# Altium footprint library Library.PcbLib: 292 footprints (part 3 of 20)
Each footprint in its own frame and in the unit in brackets; x right, y up, seen from the top. Pads: shape width x height; smd on the part's side, far side on the other; paste and mask are expansions set on the pad; w line width, h text height; cw(c..) or ccw(c..) is an arc to the next point about the centre after c.
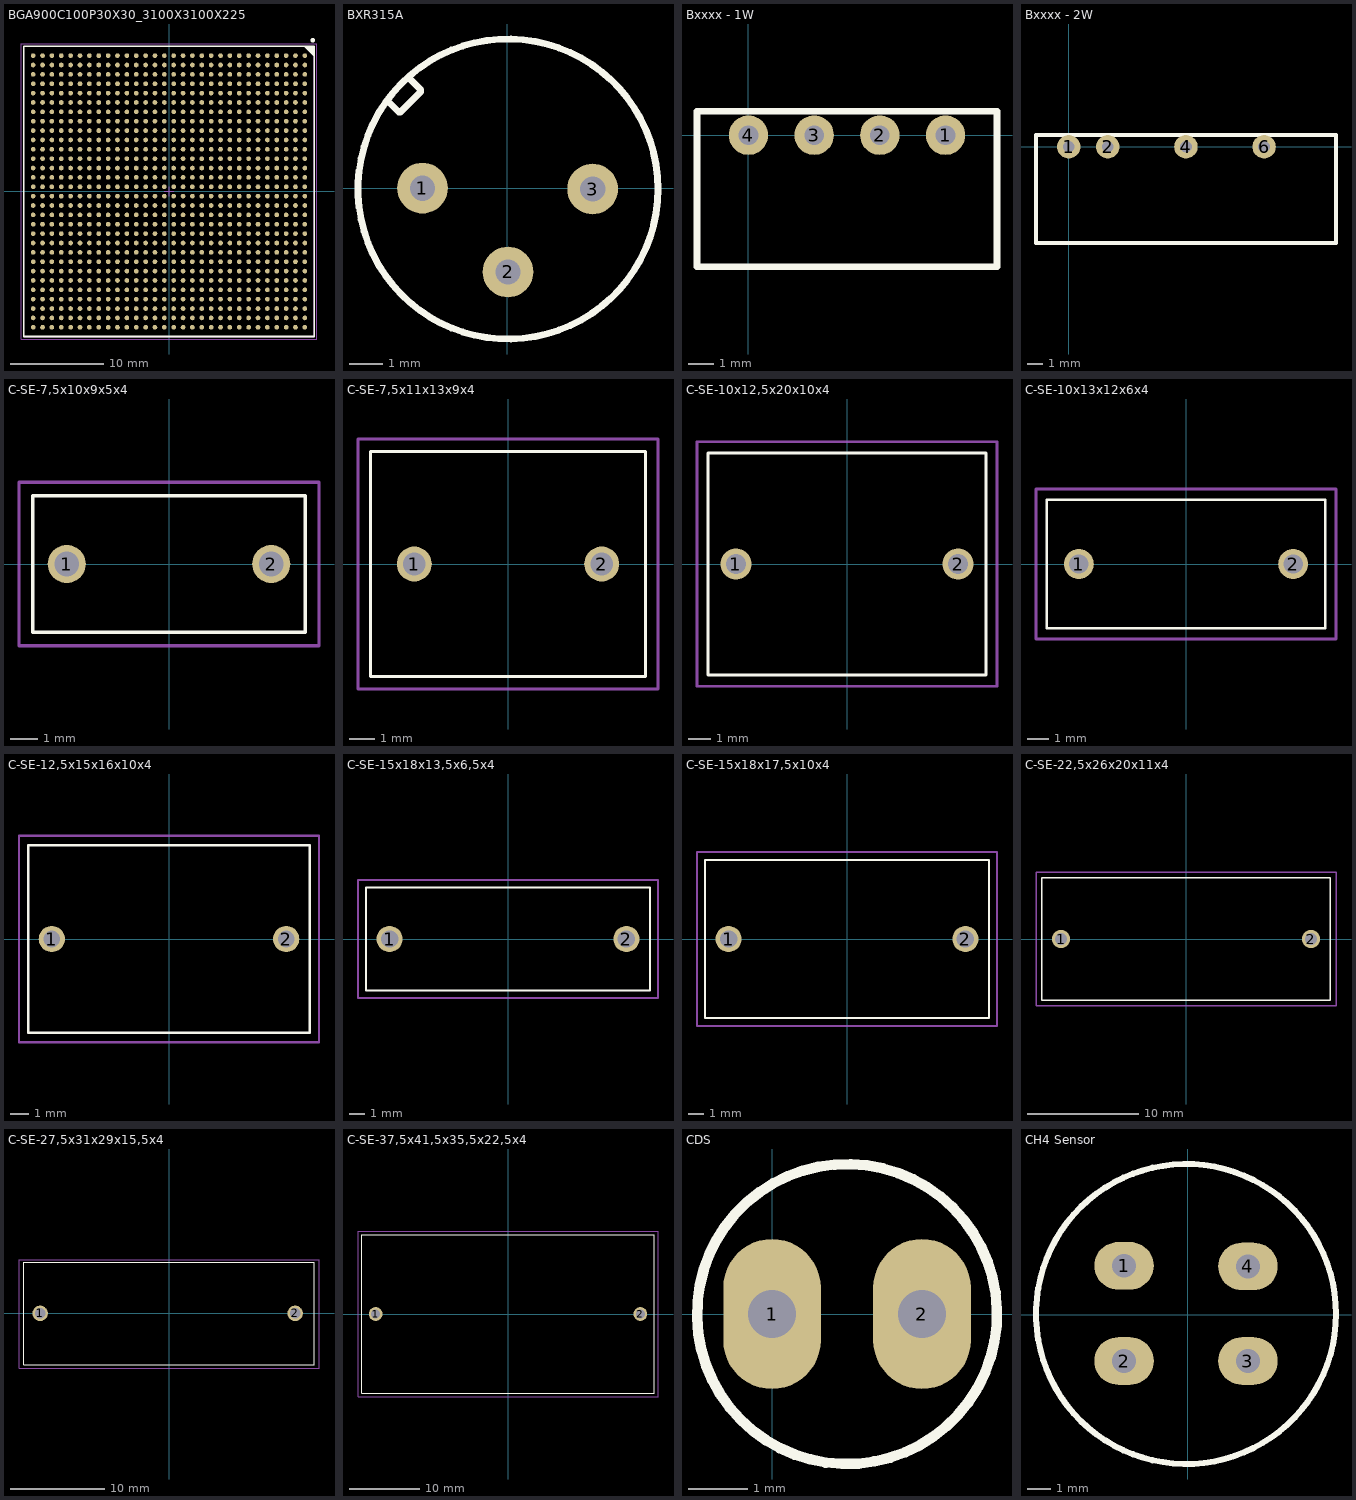
[diagram p2: the footprints below, top view; thin cyan lines are the x and y axes]

## BGA900C100P30X30_3100X3100X225 [mm] "BGA, 900-Leads, Body 31.00x31.00mmx2.25mm, Pitch 1.00mm"
height 2.25
pads (900):
  round 0.5 smd: A1(14.488,14.5) A2(14.488,13.5) A3(14.488,12.5) A4(14.488,11.5) A5(14.488,10.5) A6(14.488,9.5) A7(14.488,8.5) A8(14.488,7.5) A9(14.488,6.5) A10(14.488,5.5) A11(14.488,4.5) A12(14.488,3.5) A13(14.488,2.5) A14(14.488,1.5) A15(14.488,0.5) A16(14.488,-0.5) A17(14.488,-1.5) A18(14.488,-2.5) A19(14.488,-3.5) A20(14.488,-4.5) A21(14.488,-5.5) A22(14.488,-6.5) A23(14.488,-7.5) A24(14.488,-8.5) A25(14.488,-9.5) A26(14.488,-10.5) A27(14.488,-11.5) A28(14.488,-12.5) A29(14.488,-13.5) A30(14.488,-14.5) AA1(-5.512,14.5) AA2(-5.512,13.5) AA3(-5.512,12.5) AA4(-5.512,11.5) AA5(-5.512,10.5) AA6(-5.512,9.5) AA7(-5.512,8.5) AA8(-5.512,7.5) AA9(-5.512,6.5) AA10(-5.512,5.5) AA11(-5.512,4.5) AA12(-5.512,3.5) AA13(-5.512,2.5) AA14(-5.512,1.5) AA15(-5.512,0.5) AA16(-5.512,-0.5) AA17(-5.512,-1.5) AA18(-5.512,-2.5) AA19(-5.512,-3.5) AA20(-5.512,-4.5) AA21(-5.512,-5.5) AA22(-5.512,-6.5) AA23(-5.512,-7.5) AA24(-5.512,-8.5) AA25(-5.512,-9.5) AA26(-5.512,-10.5) AA27(-5.512,-11.5) AA28(-5.512,-12.5) AA29(-5.512,-13.5) AA30(-5.512,-14.5) AB1(-6.512,14.5) AB2(-6.512,13.5) AB3(-6.512,12.5) AB4(-6.512,11.5) AB5(-6.512,10.5) AB6(-6.512,9.5) AB7(-6.512,8.5) AB8(-6.512,7.5) AB9(-6.512,6.5) AB10(-6.512,5.5) AB11(-6.512,4.5) AB12(-6.512,3.5) AB13(-6.512,2.5) AB14(-6.512,1.5) AB15(-6.512,0.5) AB16(-6.512,-0.5) AB17(-6.512,-1.5) AB18(-6.512,-2.5) AB19(-6.512,-3.5) AB20(-6.512,-4.5) AB21(-6.512,-5.5) AB22(-6.512,-6.5) AB23(-6.512,-7.5) AB24(-6.512,-8.5) AB25(-6.512,-9.5) AB26(-6.512,-10.5) AB27(-6.512,-11.5) AB28(-6.512,-12.5) AB29(-6.512,-13.5) AB30(-6.512,-14.5) AC1(-7.512,14.5) AC2(-7.512,13.5) AC3(-7.512,12.5) AC4(-7.512,11.5) AC5(-7.512,10.5) AC6(-7.512,9.5) AC7(-7.512,8.5) AC8(-7.512,7.5) AC9(-7.512,6.5) AC10(-7.512,5.5) AC11(-7.512,4.5) AC12(-7.512,3.5) AC13(-7.512,2.5) AC14(-7.512,1.5) AC15(-7.512,0.5) AC16(-7.512,-0.5) AC17(-7.512,-1.5) AC18(-7.512,-2.5) AC19(-7.512,-3.5) AC20(-7.512,-4.5) AC21(-7.512,-5.5) AC22(-7.512,-6.5) AC23(-7.512,-7.5) AC24(-7.512,-8.5) AC25(-7.512,-9.5) AC26(-7.512,-10.5) AC27(-7.512,-11.5) AC28(-7.512,-12.5) AC29(-7.512,-13.5) AC30(-7.512,-14.5) AD1(-8.512,14.5) AD2(-8.512,13.5) AD3(-8.512,12.5) AD4(-8.512,11.5) AD5(-8.512,10.5) AD6(-8.512,9.5) AD7(-8.512,8.5) AD8(-8.512,7.5) AD9(-8.512,6.5) AD10(-8.512,5.5) AD11(-8.512,4.5) AD12(-8.512,3.5) AD13(-8.512,2.5) AD14(-8.512,1.5) AD15(-8.512,0.5) AD16(-8.512,-0.5) AD17(-8.512,-1.5) AD18(-8.512,-2.5) AD19(-8.512,-3.5) AD20(-8.512,-4.5) AD21(-8.512,-5.5) AD22(-8.512,-6.5) AD23(-8.512,-7.5) AD24(-8.512,-8.5) AD25(-8.512,-9.5) AD26(-8.512,-10.5) AD27(-8.512,-11.5) AD28(-8.512,-12.5) AD29(-8.512,-13.5) AD30(-8.512,-14.5) AE1(-9.512,14.5) AE2(-9.512,13.5) AE3(-9.512,12.5) AE4(-9.512,11.5) AE5(-9.512,10.5) AE6(-9.512,9.5) AE7(-9.512,8.5) AE8(-9.512,7.5) AE9(-9.512,6.5) AE10(-9.512,5.5) AE11(-9.512,4.5) AE12(-9.512,3.5) AE13(-9.512,2.5) AE14(-9.512,1.5) AE15(-9.512,0.5) AE16(-9.512,-0.5) AE17(-9.512,-1.5) AE18(-9.512,-2.5) AE19(-9.512,-3.5) AE20(-9.512,-4.5) AE21(-9.512,-5.5) AE22(-9.512,-6.5) AE23(-9.512,-7.5) AE24(-9.512,-8.5) AE25(-9.512,-9.5) AE26(-9.512,-10.5) AE27(-9.512,-11.5) AE28(-9.512,-12.5) AE29(-9.512,-13.5) AE30(-9.512,-14.5) AF1(-10.512,14.5) AF2(-10.512,13.5) AF3(-10.512,12.5) AF4(-10.512,11.5) AF5(-10.512,10.5) AF6(-10.512,9.5) AF7(-10.512,8.5) AF8(-10.512,7.5) AF9(-10.512,6.5) AF10(-10.512,5.5) AF11(-10.512,4.5) AF12(-10.512,3.5) AF13(-10.512,2.5) AF14(-10.512,1.5) AF15(-10.512,0.5) AF16(-10.512,-0.5) AF17(-10.512,-1.5) AF18(-10.512,-2.5) AF19(-10.512,-3.5) AF20(-10.512,-4.5) AF21(-10.512,-5.5) AF22(-10.512,-6.5) AF23(-10.512,-7.5) AF24(-10.512,-8.5) AF25(-10.512,-9.5) AF26(-10.512,-10.5) AF27(-10.512,-11.5) AF28(-10.512,-12.5) AF29(-10.512,-13.5) AF30(-10.512,-14.5) AG1(-11.512,14.5) AG2(-11.512,13.5) AG3(-11.512,12.5) AG4(-11.512,11.5) AG5(-11.512,10.5) AG6(-11.512,9.5) AG7(-11.512,8.5) AG8(-11.512,7.5) AG9(-11.512,6.5) AG10(-11.512,5.5) AG11(-11.512,4.5) AG12(-11.512,3.5) AG13(-11.512,2.5) AG14(-11.512,1.5) AG15(-11.512,0.5) AG16(-11.512,-0.5) AG17(-11.512,-1.5) AG18(-11.512,-2.5) AG19(-11.512,-3.5) AG20(-11.512,-4.5) AG21(-11.512,-5.5) AG22(-11.512,-6.5) AG23(-11.512,-7.5) AG24(-11.512,-8.5) AG25(-11.512,-9.5) AG26(-11.512,-10.5) AG27(-11.512,-11.5) AG28(-11.512,-12.5) AG29(-11.512,-13.5) AG30(-11.512,-14.5) AH1(-12.512,14.5) AH2(-12.512,13.5) AH3(-12.512,12.5) AH4(-12.512,11.5) AH5(-12.512,10.5) AH6(-12.512,9.5) AH7(-12.512,8.5) AH8(-12.512,7.5) AH9(-12.512,6.5) AH10(-12.512,5.5) AH11(-12.512,4.5) AH12(-12.512,3.5) AH13(-12.512,2.5) AH14(-12.512,1.5) AH15(-12.512,0.5) AH16(-12.512,-0.5) AH17(-12.512,-1.5) AH18(-12.512,-2.5) AH19(-12.512,-3.5) AH20(-12.512,-4.5) AH21(-12.512,-5.5) AH22(-12.512,-6.5) AH23(-12.512,-7.5) AH24(-12.512,-8.5) AH25(-12.512,-9.5) AH26(-12.512,-10.5) AH27(-12.512,-11.5) AH28(-12.512,-12.5) AH29(-12.512,-13.5) AH30(-12.512,-14.5) AJ1(-13.512,14.5) AJ2(-13.512,13.5) AJ3(-13.512,12.5) AJ4(-13.512,11.5) AJ5(-13.512,10.5) AJ6(-13.512,9.5) AJ7(-13.512,8.5) AJ8(-13.512,7.5) AJ9(-13.512,6.5) AJ10(-13.512,5.5) AJ11(-13.512,4.5) AJ12(-13.512,3.5) AJ13(-13.512,2.5) AJ14(-13.512,1.5) AJ15(-13.512,0.5) AJ16(-13.512,-0.5) AJ17(-13.512,-1.5) AJ18(-13.512,-2.5) AJ19(-13.512,-3.5) AJ20(-13.512,-4.5) AJ21(-13.512,-5.5) AJ22(-13.512,-6.5) AJ23(-13.512,-7.5) AJ24(-13.512,-8.5) AJ25(-13.512,-9.5) AJ26(-13.512,-10.5) AJ27(-13.512,-11.5) AJ28(-13.512,-12.5) AJ29(-13.512,-13.5) AJ30(-13.512,-14.5) AK1(-14.512,14.5) AK2(-14.512,13.5) AK3(-14.512,12.5) AK4(-14.512,11.5) AK5(-14.512,10.5) AK6(-14.512,9.5) AK7(-14.512,8.5) AK8(-14.512,7.5) AK9(-14.512,6.5) AK10(-14.512,5.5) AK11(-14.512,4.5) AK12(-14.512,3.5) AK13(-14.512,2.5) AK14(-14.512,1.5) AK15(-14.512,0.5) AK16(-14.512,-0.5) AK17(-14.512,-1.5) AK18(-14.512,-2.5) AK19(-14.512,-3.5) AK20(-14.512,-4.5) AK21(-14.512,-5.5) AK22(-14.512,-6.5) AK23(-14.512,-7.5) AK24(-14.512,-8.5) AK25(-14.512,-9.5) AK26(-14.512,-10.5) AK27(-14.512,-11.5) AK28(-14.512,-12.5) AK29(-14.512,-13.5) AK30(-14.512,-14.5) B1(13.488,14.5) B2(13.488,13.5) B3(13.488,12.5) B4(13.488,11.5) B5(13.488,10.5) B6(13.488,9.5) B7(13.488,8.5) B8(13.488,7.5) B9(13.488,6.5) B10(13.488,5.5) B11(13.488,4.5) B12(13.488,3.5) B13(13.488,2.5) B14(13.488,1.5) B15(13.488,0.5) B16(13.488,-0.5) B17(13.488,-1.5) B18(13.488,-2.5) B19(13.488,-3.5) B20(13.488,-4.5) B21(13.488,-5.5) B22(13.488,-6.5) B23(13.488,-7.5) B24(13.488,-8.5) B25(13.488,-9.5) B26(13.488,-10.5) B27(13.488,-11.5) B28(13.488,-12.5) B29(13.488,-13.5) B30(13.488,-14.5) C1(12.488,14.5) C2(12.488,13.5) C3(12.488,12.5) C4(12.488,11.5) C5(12.488,10.5) C6(12.488,9.5) C7(12.488,8.5) C8(12.488,7.5) C9(12.488,6.5) C10(12.488,5.5) C11(12.488,4.5) C12(12.488,3.5) C13(12.488,2.5) C14(12.488,1.5) C15(12.488,0.5) C16(12.488,-0.5) C17(12.488,-1.5) C18(12.488,-2.5) C19(12.488,-3.5) C20(12.488,-4.5) C21(12.488,-5.5) C22(12.488,-6.5) C23(12.488,-7.5) C24(12.488,-8.5) C25(12.488,-9.5) C26(12.488,-10.5) C27(12.488,-11.5) C28(12.488,-12.5) C29(12.488,-13.5) C30(12.488,-14.5) D1(11.488,14.5) D2(11.488,13.5) D3(11.488,12.5) D4(11.488,11.5) D5(11.488,10.5) D6(11.488,9.5) D7(11.488,8.5) D8(11.488,7.5) D9(11.488,6.5) D10(11.488,5.5) D11(11.488,4.5) D12(11.488,3.5) D13(11.488,2.5) D14(11.488,1.5) D15(11.488,0.5) D16(11.488,-0.5) D17(11.488,-1.5) D18(11.488,-2.5) D19(11.488,-3.5) D20(11.488,-4.5) D21(11.488,-5.5) D22(11.488,-6.5) D23(11.488,-7.5) D24(11.488,-8.5) D25(11.488,-9.5) D26(11.488,-10.5) D27(11.488,-11.5) D28(11.488,-12.5) D29(11.488,-13.5) D30(11.488,-14.5) E1(10.488,14.5) E2(10.488,13.5) E3(10.488,12.5) E4(10.488,11.5) E5(10.488,10.5) E6(10.488,9.5) E7(10.488,8.5) E8(10.488,7.5) E9(10.488,6.5) E10(10.488,5.5) E11(10.488,4.5) E12(10.488,3.5) E13(10.488,2.5) E14(10.488,1.5) E15(10.488,0.5) E16(10.488,-0.5) E17(10.488,-1.5) E18(10.488,-2.5) E19(10.488,-3.5) E20(10.488,-4.5) E21(10.488,-5.5) E22(10.488,-6.5) E23(10.488,-7.5) E24(10.488,-8.5) E25(10.488,-9.5) E26(10.488,-10.5) E27(10.488,-11.5) E28(10.488,-12.5) E29(10.488,-13.5) E30(10.488,-14.5) F1(9.488,14.5) F2(9.488,13.5) F3(9.488,12.5) F4(9.488,11.5) F5(9.488,10.5) F6(9.488,9.5) F7(9.488,8.5) F8(9.488,7.5) F9(9.488,6.5) F10(9.488,5.5) F11(9.488,4.5) F12(9.488,3.5) F13(9.488,2.5) F14(9.488,1.5) F15(9.488,0.5) F16(9.488,-0.5) F17(9.488,-1.5) F18(9.488,-2.5) F19(9.488,-3.5) F20(9.488,-4.5) F21(9.488,-5.5) F22(9.488,-6.5) F23(9.488,-7.5) F24(9.488,-8.5) F25(9.488,-9.5) F26(9.488,-10.5) F27(9.488,-11.5) F28(9.488,-12.5) F29(9.488,-13.5) F30(9.488,-14.5) G1(8.488,14.5) G2(8.488,13.5) G3(8.488,12.5) G4(8.488,11.5) G5(8.488,10.5) G6(8.488,9.5) G7(8.488,8.5) G8(8.488,7.5) G9(8.488,6.5) G10(8.488,5.5) G11(8.488,4.5) G12(8.488,3.5) G13(8.488,2.5) G14(8.488,1.5) G15(8.488,0.5) G16(8.488,-0.5) G17(8.488,-1.5) G18(8.488,-2.5) G19(8.488,-3.5) G20(8.488,-4.5) G21(8.488,-5.5) G22(8.488,-6.5) G23(8.488,-7.5) G24(8.488,-8.5) G25(8.488,-9.5) G26(8.488,-10.5) G27(8.488,-11.5) G28(8.488,-12.5) G29(8.488,-13.5) G30(8.488,-14.5) H1(7.488,14.5) H2(7.488,13.5) H3(7.488,12.5) H4(7.488,11.5) H5(7.488,10.5) H6(7.488,9.5) H7(7.488,8.5) H8(7.488,7.5) H9(7.488,6.5) H10(7.488,5.5) H11(7.488,4.5) H12(7.488,3.5) H13(7.488,2.5) H14(7.488,1.5) H15(7.488,0.5) H16(7.488,-0.5) H17(7.488,-1.5) H18(7.488,-2.5) H19(7.488,-3.5) H20(7.488,-4.5) H21(7.488,-5.5) H22(7.488,-6.5) H23(7.488,-7.5) H24(7.488,-8.5) H25(7.488,-9.5) H26(7.488,-10.5) H27(7.488,-11.5) H28(7.488,-12.5) H29(7.488,-13.5) H30(7.488,-14.5) J1(6.488,14.5) J2(6.488,13.5) J3(6.488,12.5) J4(6.488,11.5) J5(6.488,10.5) J6(6.488,9.5) J7(6.488,8.5) J8(6.488,7.5) J9(6.488,6.5) J10(6.488,5.5) J11(6.488,4.5) J12(6.488,3.5) J13(6.488,2.5) J14(6.488,1.5) J15(6.488,0.5) J16(6.488,-0.5) J17(6.488,-1.5) J18(6.488,-2.5) J19(6.488,-3.5) J20(6.488,-4.5) J21(6.488,-5.5) J22(6.488,-6.5) J23(6.488,-7.5) J24(6.488,-8.5) J25(6.488,-9.5) J26(6.488,-10.5) J27(6.488,-11.5) J28(6.488,-12.5) J29(6.488,-13.5) J30(6.488,-14.5) K1(5.488,14.5) K2(5.488,13.5) K3(5.488,12.5) K4(5.488,11.5) K5(5.488,10.5) K6(5.488,9.5) K7(5.488,8.5) K8(5.488,7.5) K9(5.488,6.5) K10(5.488,5.5) K11(5.488,4.5) K12(5.488,3.5) K13(5.488,2.5) K14(5.488,1.5) K15(5.488,0.5) K16(5.488,-0.5) K17(5.488,-1.5) K18(5.488,-2.5) K19(5.488,-3.5) K20(5.488,-4.5) K21(5.488,-5.5) K22(5.488,-6.5) K23(5.488,-7.5) K24(5.488,-8.5) K25(5.488,-9.5) K26(5.488,-10.5) K27(5.488,-11.5) K28(5.488,-12.5) K29(5.488,-13.5) K30(5.488,-14.5) L1(4.488,14.5) L2(4.488,13.5) L3(4.488,12.5) L4(4.488,11.5) L5(4.488,10.5) L6(4.488,9.5) L7(4.488,8.5) L8(4.488,7.5) L9(4.488,6.5) L10(4.488,5.5) L11(4.488,4.5) L12(4.488,3.5) L13(4.488,2.5) L14(4.488,1.5) L15(4.488,0.5) L16(4.488,-0.5) L17(4.488,-1.5) L18(4.488,-2.5) L19(4.488,-3.5) L20(4.488,-4.5) L21(4.488,-5.5) L22(4.488,-6.5) L23(4.488,-7.5) L24(4.488,-8.5) L25(4.488,-9.5) L26(4.488,-10.5) L27(4.488,-11.5) L28(4.488,-12.5) L29(4.488,-13.5) L30(4.488,-14.5) M1(3.488,14.5) M2(3.488,13.5) M3(3.488,12.5) M4(3.488,11.5) M5(3.488,10.5) M6(3.488,9.5) M7(3.488,8.5) M8(3.488,7.5) M9(3.488,6.5) M10(3.488,5.5) M11(3.488,4.5) M12(3.488,3.5) M13(3.488,2.5) M14(3.488,1.5) M15(3.488,0.5) M16(3.488,-0.5) M17(3.488,-1.5) M18(3.488,-2.5) M19(3.488,-3.5) M20(3.488,-4.5) M21(3.488,-5.5) M22(3.488,-6.5) M23(3.488,-7.5) M24(3.488,-8.5) M25(3.488,-9.5) M26(3.488,-10.5) M27(3.488,-11.5) M28(3.488,-12.5) M29(3.488,-13.5) M30(3.488,-14.5) N1(2.488,14.5) N2(2.488,13.5) N3(2.488,12.5) N4(2.488,11.5) N5(2.488,10.5) N6(2.488,9.5) N7(2.488,8.5) N8(2.488,7.5) N9(2.488,6.5) N10(2.488,5.5) N11(2.488,4.5) N12(2.488,3.5) N13(2.488,2.5) N14(2.488,1.5) N15(2.488,0.5) N16(2.488,-0.5) N17(2.488,-1.5) N18(2.488,-2.5) N19(2.488,-3.5) N20(2.488,-4.5) N21(2.488,-5.5) N22(2.488,-6.5) N23(2.488,-7.5) N24(2.488,-8.5) N25(2.488,-9.5) N26(2.488,-10.5) N27(2.488,-11.5) N28(2.488,-12.5) N29(2.488,-13.5) N30(2.488,-14.5) P1(1.488,14.5) P2(1.488,13.5) P3(1.488,12.5) P4(1.488,11.5) P5(1.488,10.5) P6(1.488,9.5) P7(1.488,8.5) P8(1.488,7.5) P9(1.488,6.5) P10(1.488,5.5) P11(1.488,4.5) P12(1.488,3.5) P13(1.488,2.5) P14(1.488,1.5) P15(1.488,0.5) P16(1.488,-0.5) P17(1.488,-1.5) P18(1.488,-2.5) P19(1.488,-3.5) P20(1.488,-4.5) P21(1.488,-5.5) P22(1.488,-6.5) P23(1.488,-7.5) P24(1.488,-8.5) P25(1.488,-9.5) P26(1.488,-10.5) P27(1.488,-11.5) P28(1.488,-12.5) P29(1.488,-13.5) P30(1.488,-14.5) R1(0.488,14.5) R2(0.488,13.5) R3(0.488,12.5) R4(0.488,11.5) R5(0.488,10.5) R6(0.488,9.5) R7(0.488,8.5) R8(0.488,7.5) R9(0.488,6.5) R10(0.488,5.5) R11(0.488,4.5) R12(0.488,3.5) R13(0.488,2.5) R14(0.488,1.5) R15(0.488,0.5) R16(0.488,-0.5) R17(0.488,-1.5) R18(0.488,-2.5) R19(0.488,-3.5) R20(0.488,-4.5) R21(0.488,-5.5) R22(0.488,-6.5) R23(0.488,-7.5) R24(0.488,-8.5) R25(0.488,-9.5) R26(0.488,-10.5) R27(0.488,-11.5) R28(0.488,-12.5) R29(0.488,-13.5) R30(0.488,-14.5) T1(-0.512,14.5) T2(-0.512,13.5) T3(-0.512,12.5) T4(-0.512,11.5) T5(-0.512,10.5) T6(-0.512,9.5) T7(-0.512,8.5) T8(-0.512,7.5) T9(-0.512,6.5) T10(-0.512,5.5) T11(-0.512,4.5) T12(-0.512,3.5) T13(-0.512,2.5) T14(-0.512,1.5) T15(-0.512,0.5) T16(-0.512,-0.5) T17(-0.512,-1.5) T18(-0.512,-2.5) T19(-0.512,-3.5) T20(-0.512,-4.5) T21(-0.512,-5.5) T22(-0.512,-6.5) T23(-0.512,-7.5) T24(-0.512,-8.5) T25(-0.512,-9.5) T26(-0.512,-10.5) T27(-0.512,-11.5) T28(-0.512,-12.5) T29(-0.512,-13.5) T30(-0.512,-14.5) U1(-1.512,14.5) U2(-1.512,13.5) U3(-1.512,12.5) U4(-1.512,11.5) U5(-1.512,10.5) U6(-1.512,9.5) U7(-1.512,8.5) U8(-1.512,7.5) U9(-1.512,6.5) U10(-1.512,5.5) U11(-1.512,4.5) U12(-1.512,3.5) U13(-1.512,2.5) U14(-1.512,1.5) U15(-1.512,0.5) U16(-1.512,-0.5) U17(-1.512,-1.5) U18(-1.512,-2.5) U19(-1.512,-3.5) U20(-1.512,-4.5) U21(-1.512,-5.5) U22(-1.512,-6.5) U23(-1.512,-7.5) U24(-1.512,-8.5) U25(-1.512,-9.5) U26(-1.512,-10.5) U27(-1.512,-11.5) U28(-1.512,-12.5) U29(-1.512,-13.5) U30(-1.512,-14.5) V1(-2.512,14.5) V2(-2.512,13.5) V3(-2.512,12.5) V4(-2.512,11.5) V5(-2.512,10.5) V6(-2.512,9.5) V7(-2.512,8.5) V8(-2.512,7.5) V9(-2.512,6.5) V10(-2.512,5.5) V11(-2.512,4.5) V12(-2.512,3.5) V13(-2.512,2.5) V14(-2.512,1.5) V15(-2.512,0.5) V16(-2.512,-0.5) V17(-2.512,-1.5) V18(-2.512,-2.5) V19(-2.512,-3.5) V20(-2.512,-4.5) V21(-2.512,-5.5) V22(-2.512,-6.5) V23(-2.512,-7.5) V24(-2.512,-8.5) V25(-2.512,-9.5) V26(-2.512,-10.5) V27(-2.512,-11.5) V28(-2.512,-12.5) V29(-2.512,-13.5) V30(-2.512,-14.5) W1(-3.512,14.5) W2(-3.512,13.5) W3(-3.512,12.5) W4(-3.512,11.5) W5(-3.512,10.5) W6(-3.512,9.5) W7(-3.512,8.5) W8(-3.512,7.5) W9(-3.512,6.5) W10(-3.512,5.5) W11(-3.512,4.5) W12(-3.512,3.5) W13(-3.512,2.5) W14(-3.512,1.5) W15(-3.512,0.5) W16(-3.512,-0.5) W17(-3.512,-1.5) W18(-3.512,-2.5) W19(-3.512,-3.5) W20(-3.512,-4.5) W21(-3.512,-5.5) W22(-3.512,-6.5) W23(-3.512,-7.5) W24(-3.512,-8.5) W25(-3.512,-9.5) W26(-3.512,-10.5) W27(-3.512,-11.5) W28(-3.512,-12.5) W29(-3.512,-13.5) W30(-3.512,-14.5) Y1(-4.512,14.5) Y2(-4.512,13.5) Y3(-4.512,12.5) Y4(-4.512,11.5) Y5(-4.512,10.5) Y6(-4.512,9.5) Y7(-4.512,8.5) Y8(-4.512,7.5) Y9(-4.512,6.5) Y10(-4.512,5.5) Y11(-4.512,4.5) Y12(-4.512,3.5) Y13(-4.512,2.5) Y14(-4.512,1.5) Y15(-4.512,0.5) Y16(-4.512,-0.5) Y17(-4.512,-1.5) Y18(-4.512,-2.5) Y19(-4.512,-3.5) Y20(-4.512,-4.5) Y21(-4.512,-5.5) Y22(-4.512,-6.5) Y23(-4.512,-7.5) Y24(-4.512,-8.5) Y25(-4.512,-9.5) Y26(-4.512,-10.5) Y27(-4.512,-11.5) Y28(-4.512,-12.5) Y29(-4.512,-13.5) Y30(-4.512,-14.5)
Top Overlay:
  circle w0.25: c15.338,16.15 r0.125
  region: 15.488,14.5 14.488,15.5 15.488,15.5
  lines w0.2: 14.488,15.5 15.488,14.5 ; -15.512,-15.5 -15.512,15.5 15.488,15.5 15.488,-15.5 -15.512,-15.5
Mechanical 13:
  lines w0.1: -15.512,-15.5 -15.512,15.5 15.488,15.5 15.488,-15.5 -15.512,-15.5
Mechanical 15:
  lines w0.05: -15.762,-15.75 -15.762,15.75 15.738,15.75 15.738,-15.75 -15.762,-15.75
  lines w0.1: -0.512,0 0.488,0 ; -0.012,-0.5 -0.012,0.5
3D body "User Library-FGG900.step": height 2.25, standoff 0, extent -15.506,-15.494 15.494,15.506

## BXR315A [mil] "Xtal for RF"
pads (3):
  round 60 hole 30: 1(-100,0) 2(1,-99) 3(101,-1)
Top Overlay:
  circle w8: c1,-1 r177.17
  lines w8: -141,103 -128,90 -126,90 -102,114 -102,116 -115,129
3D body "User Library-PIR_S_Orginal.step": height 187.01, standoff -76.77, extent -179.13,-179.14 179.13,179.09

## Bxxxx - 1W [mil]
pads (4):
  round 60 hole 30: 1(300,0) 2(200,0) 3(100,0) 4(0,0)
Top Overlay:
  lines w10: -78.35,-200 378.35,-200 378.35,36.22 -78.35,36.22 -78.35,-200
3D body "DC-DC_B5050S-1W.stp": height 400, standoff -161.42, extent -78.35,-200 378.35,36.22

## Bxxxx - 2W [mil]
pads (4):
  round 60 hole 30: 1(0,0) 2(100,0) 4(300,0) 6(500,0)
Top Overlay:
  lines w10: -83.69,-245.78 684.03,-245.78 684.03,29.81 -83.69,29.81 -83.69,-245.78
3D body "B1205S-2W.STEP": height 409.45, standoff -145.67, extent -83.69,-245.78 684.03,29.81

## C-SE-7,5x10x9x5x4 [mm] "Film Capacitors, 2-Leads, Body 7,5x10x9x5"
height 9
pads (2):
  round 1.4 hole 0.9: 1(-3.75,0) 2(3.75,0)
Top Overlay:
  lines w0.127: -5,-2.5 5,-2.5 5,2.5 -5,2.5 -5,-2.5
Mechanical 15:
  lines w0.127: -5.5,-3 5.5,-3 5.5,3 -5.5,3 -5.5,-3
3D body "7,5x10x9x5_CS.stp": height 9.01, standoff -3.99, extent -5,-2.5 5,2.5

## C-SE-7,5x11x13x9x4 [mm] "Film Capacitors, 2-Leads, Body 7,5x11x13x9"
height 13
pads (2):
  round 1.4 hole 0.9: 1(-3.75,0) 2(3.75,0)
Top Overlay:
  lines w0.127: -5.5,-4.5 5.5,-4.5 5.5,4.5 -5.5,4.5 -5.5,-4.5
Mechanical 15:
  lines w0.127: -6,-5 6,-5 6,5 -6,5 -6,-5
3D body "7,5x11x13x9_CS.stp": height 13.01, standoff -3.99, extent -5.5,-4.5 5.5,4.5

## C-SE-10x12,5x20x10x4 [mm] "Film Capacitors, 2-Leads, Body 10x12,5x20x10"
height 20
pads (2):
  round 1.4 hole 0.9: 1(-5,0) 2(5,0)
Top Overlay:
  lines w0.127: -6.25,-5 -6.25,5 6.25,5 6.25,-5 -6.25,-5
Mechanical 15:
  lines w0.127: -6.75,-5.5 -6.75,5.5 6.75,5.5 6.75,-5.5 -6.75,-5.5
3D body "10x12,5x20x10_CS.stp": height 20.01, standoff -3.99, extent -6.25,-5 6.25,5

## C-SE-10x13x12x6x4 [mm] "Film Capacitors, 2-Leads, Body 10x13x12x6"
height 12
pads (2):
  round 1.4 hole 0.9: 1(-5,0) 2(5,0)
Top Overlay:
  lines w0.127: -6.5,-3 -6.5,3 6.5,3 6.5,-3 -6.5,-3
Mechanical 15:
  lines w0.127: -7,-3.5 -7,3.5 7,3.5 7,-3.5 -7,-3.5
3D body "10x13x12x6_CS.stp": height 12.01, standoff -3.99, extent -6.5,-3 6.5,3

## C-SE-12,5x15x16x10x4 [mm] "Film Capacitors, 2-Leads, Body 12,5x15x16x10"
height 16
pads (2):
  round 1.4 hole 0.9: 1(-6.25,0) 2(6.25,0)
Top Overlay:
  lines w0.127: -7.5,-5 -7.5,5 7.5,5 7.5,-5 -7.5,-5
Mechanical 15:
  lines w0.127: -8,-5.5 -8,5.5 8,5.5 8,-5.5 -8,-5.5
3D body "12,5x15x16x10_CS.stp": height 16.01, standoff -3.99, extent -7.5,-5 7.5,5

## C-SE-15x18x13,5x6,5x4 [mm] "Film Capacitors, 2-Leads, Body 15x18x13,5x6,5"
height 13.5
pads (2):
  round 1.65 hole 1.1: 1(-7.5,0) 2(7.5,0)
Top Overlay:
  lines w0.127: -9,-3.25 9,-3.25 9,3.25 -9,3.25 -9,-3.25
Mechanical 15:
  lines w0.127: -9.5,-3.75 9.5,-3.75 9.5,3.75 -9.5,3.75 -9.5,-3.75
3D body "15x18x13,5x6,5_CS.stp": height 13.51, standoff -3.99, extent -9,-3.25 9,3.25

## C-SE-15x18x17,5x10x4 [mm] "Film Capacitors, 2-Leads, Body 15x18x17,5x10"
height 17.5
pads (2):
  round 1.65 hole 1.1: 1(-7.5,0) 2(7.5,0)
Top Overlay:
  lines w0.127: -9,-5 -9,5 9,5 9,-5 -9,-5
Mechanical 15:
  lines w0.127: -9.5,-5.5 -9.5,5.5 9.5,5.5 9.5,-5.5 -9.5,-5.5
3D body "15x18x17,5x10_CS.stp": height 17.51, standoff -3.99, extent -9,-5 9,5

## C-SE-22,5x26x20x11x4 [mm] "Film Capacitors, 2-Leads, Body 22,5x26x20x11"
height 20
pads (2):
  round 1.65 hole 1.1: 1(-11.25,0) 2(11.25,0)
Top Overlay:
  lines w0.127: -13,-5.5 13,-5.5 13,5.5 -13,5.5 -13,-5.5
Mechanical 15:
  lines w0.127: -13.5,-6 13.5,-6 13.5,6 -13.5,6 -13.5,-6
3D body "22,5x26x20x11_CS.stp": height 20.01, standoff -3.99, extent -13,-5.5 13,5.5

## C-SE-27,5x31x29x15,5x4 [mm] "0.47uF/250V"
height 29
pads (2):
  round 1.65 hole 1.1: 1(-13.75,0) 2(13.462,0)
Top Overlay:
  lines w0.127: -15.5,-5.461 -15.5,5.461 15.5,5.461 15.5,-5.461 -15.5,-5.461
Mechanical 15:
  lines w0.127: -16,-5.842 -16,5.715 16,5.715 16,-5.842 -16,-5.842
3D body: height 19.8, standoff -3.63, extent -15.748,-5.329 15.452,5.329

## C-SE-37,5x41,5x35,5x22,5x4 [mm] "Film Capacitors, 2-Leads, Body 37,5x41,5x35,5x22,5"
height 35.5
pads (2):
  round 1.95 hole 1.3: 1(-18.75,0) 2(18.75,0)
Top Overlay:
  lines w0.127: -20.75,-11.25 -20.75,11.25 20.75,11.25 20.75,-11.25 -20.75,-11.25
Mechanical 15:
  lines w0.127: -21.25,-11.75 -21.25,11.75 21.25,11.75 21.25,-11.75 -21.25,-11.75
3D body "37,5x41,5x35,5x22,5_CS.stp": height 35.51, standoff -3.99, extent -20.75,-11.25 20.75,11.25

## CDS [mil] "QUANG TRO"
height 300
pads (2):
  oval 65x100 hole 32: 1(0,0) 2(100,0)
Top Overlay:
  lines w7: 136.62,-49.97 cw(c50,0) 137.42,-48.56
3D body "LDR.STEP": height 138.19, standoff -48.43, extent -52.56,-80 152.56,89.29

## CH4 Sensor [mm]
pads (4):
  oval 2.5x2 hole 1: 1(-2.667,2.057) 2(-2.667,-1.943) 3(2.533,-1.943) 4(2.533,2.032)
Top Overlay:
  circle w0.254: c-0.067,0.032 r6.3